# Altium integrated library esd_library.IntLib: 989 symbols (part 6 of 6)
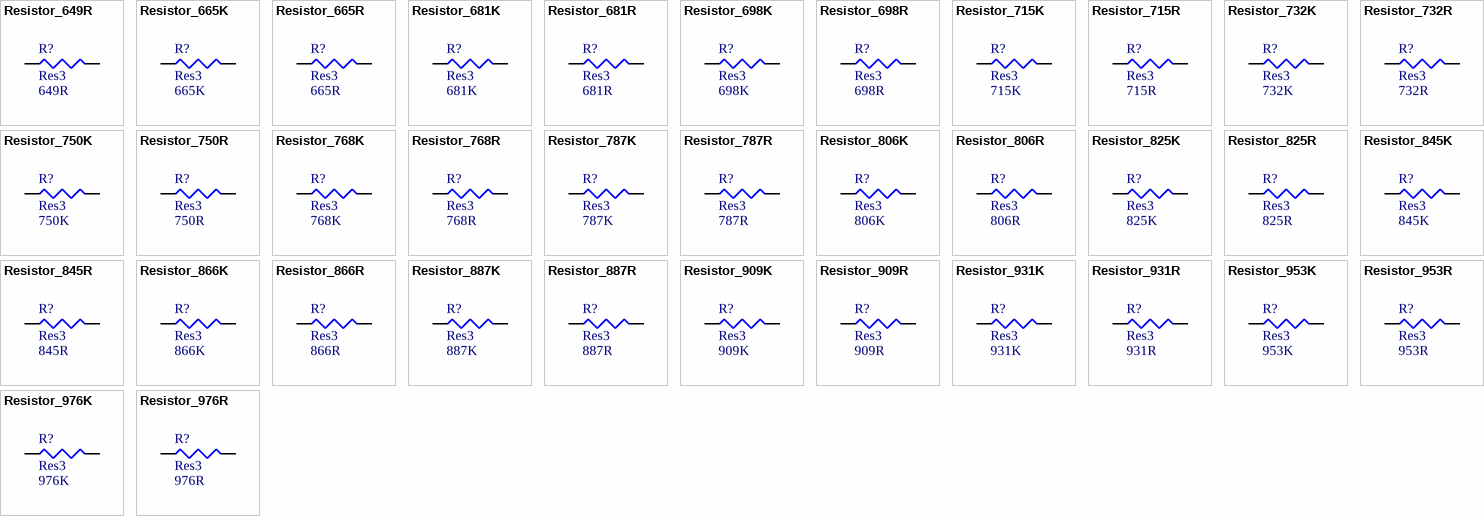
[diagram p31: symbols Resistor_649R to Resistor_976R]

## Resistor_665R
designator R?, comment Res3  value 665R
RES SMD 665R OHM 1% 1/8W 0805; MPN: CRCW0805665RFKEA; Name: Resistor_665R; PN: 541-665CCT-ND; URL: http://www.digikey.ca/product-detail/en/CRCW0805665RFKEA/541-665CCT-ND
footprint RESC2112X05M (Chip Resistor, 2-Leads, Body 2.05x1.25mm, IPC Low Density)
pins: 1, 2

## Resistor_681K
designator R?, comment Res3  value 681K
RES SMD 681K OHM 1% 1/8W 0805; MPN: CRCW0805681KFKEA; Name: Resistor_681K; PN: 541-681KCCT-ND; URL: http://www.digikey.ca/product-detail/en/CRCW0805681KFKEA/541-681KCCT-ND
footprint RESC2112X05M (Chip Resistor, 2-Leads, Body 2.05x1.25mm, IPC Low Density)
pins: 1, 2

## Resistor_681R
designator R?, comment Res3  value 681R
RES SMD 681R OHM 1% 1/8W 0805; MPN: CRCW0805681RFKEA; Name: Resistor_681R; PN: 541-681CCT-ND; URL: http://www.digikey.ca/product-detail/en/CRCW0805681RFKEA/541-681CCT-ND
footprint RESC2112X05M (Chip Resistor, 2-Leads, Body 2.05x1.25mm, IPC Low Density)
pins: 1, 2

## Resistor_698K
designator R?, comment Res3  value 698K
RES SMD 698K OHM 1% 1/8W 0805; MPN: CRCW0805698KFKEA; Name: Resistor_698K; PN: 541-698KCCT-ND; URL: http://www.digikey.ca/product-detail/en/CRCW0805698KFKEA/541-698KCCT-ND
footprint RESC2112X05M (Chip Resistor, 2-Leads, Body 2.05x1.25mm, IPC Low Density)
pins: 1, 2

## Resistor_698R
designator R?, comment Res3  value 698R
RES SMD 698R OHM 1% 1/8W 0805; MPN: CRCW0805698RFKEA; Name: Resistor_698R; PN: 541-698CCT-ND; URL: http://www.digikey.ca/product-detail/en/CRCW0805698RFKEA/541-698CCT-ND
footprint RESC2112X05M (Chip Resistor, 2-Leads, Body 2.05x1.25mm, IPC Low Density)
pins: 1, 2

## Resistor_715K
designator R?, comment Res3  value 715K
RES SMD 715K OHM 1% 1/8W 0805; MPN: CRCW0805715KFKEA; Name: Resistor_715K; PN: 541-715KCCT-ND; URL: http://www.digikey.ca/product-detail/en/CRCW0805715KFKEA/541-715KCCT-ND
footprint RESC2112X05M (Chip Resistor, 2-Leads, Body 2.05x1.25mm, IPC Low Density)
pins: 1, 2

## Resistor_715R
designator R?, comment Res3  value 715R
RES SMD 715R OHM 1% 1/8W 0805; MPN: CRCW0805715RFKEA; Name: Resistor_715R; PN: 541-715CCT-ND; URL: http://www.digikey.ca/product-detail/en/CRCW0805715RFKEA/541-715CCT-ND
footprint RESC2112X05M (Chip Resistor, 2-Leads, Body 2.05x1.25mm, IPC Low Density)
pins: 1, 2

## Resistor_732K
designator R?, comment Res3  value 732K
RES SMD 732K OHM 1% 1/8W 0805; MPN: CRCW0805732KFKEA; Name: Resistor_732K; PN: 541-732KCCT-ND; URL: http://www.digikey.ca/product-detail/en/CRCW0805732KFKEA/541-732KCCT-ND
footprint RESC2112X05M (Chip Resistor, 2-Leads, Body 2.05x1.25mm, IPC Low Density)
pins: 1, 2

## Resistor_732R
designator R?, comment Res3  value 732R
RES SMD 732R OHM 1% 1/8W 0805; MPN: CRCW0805732RFKEA; Name: Resistor_732R; PN: 541-732CCT-ND; URL: http://www.digikey.ca/product-detail/en/CRCW0805732RFKEA/541-732CCT-ND
footprint RESC2112X05M (Chip Resistor, 2-Leads, Body 2.05x1.25mm, IPC Low Density)
pins: 1, 2

## Resistor_750K
designator R?, comment Res3  value 750K
RES SMD 750K OHM 1% 1/8W 0805; MPN: CRCW0805750KFKEA; Name: Resistor_750K; PN: 541-750KCCT-ND; URL: http://www.digikey.ca/product-detail/en/CRCW0805750KFKEA/541-750KCCT-ND
footprint RESC2112X05M (Chip Resistor, 2-Leads, Body 2.05x1.25mm, IPC Low Density)
pins: 1, 2

## Resistor_750R
designator R?, comment Res3  value 750R
RES SMD 750R OHM 1% 1/8W 0805; MPN: CRCW0805750RFKEA; Name: Resistor_750R; PN: 541-750CCT-ND; URL: http://www.digikey.ca/product-detail/en/CRCW0805750RFKEA/541-750CCT-ND
footprint RESC2112X05M (Chip Resistor, 2-Leads, Body 2.05x1.25mm, IPC Low Density)
pins: 1, 2

## Resistor_768K
designator R?, comment Res3  value 768K
RES SMD 768K OHM 1% 1/8W 0805; MPN: CRCW0805768KFKEA; Name: Resistor_768K; PN: 541-768KCCT-ND; URL: http://www.digikey.ca/product-detail/en/CRCW0805768KFKEA/541-768KCCT-ND
footprint RESC2112X05M (Chip Resistor, 2-Leads, Body 2.05x1.25mm, IPC Low Density)
pins: 1, 2

## Resistor_768R
designator R?, comment Res3  value 768R
RES SMD 768R OHM 1% 1/8W 0805; MPN: CRCW0805768RFKEA; Name: Resistor_768R; PN: 541-768CCT-ND; URL: http://www.digikey.ca/product-detail/en/CRCW0805768RFKEA/541-768CCT-ND
footprint RESC2112X05M (Chip Resistor, 2-Leads, Body 2.05x1.25mm, IPC Low Density)
pins: 1, 2

## Resistor_787K
designator R?, comment Res3  value 787K
RES SMD 787K OHM 1% 1/8W 0805; MPN: CRCW0805787KFKEA; Name: Resistor_787K; PN: 541-787KCCT-ND; URL: http://www.digikey.ca/product-detail/en/CRCW0805787KFKEA/541-787KCCT-ND
footprint RESC2112X05M (Chip Resistor, 2-Leads, Body 2.05x1.25mm, IPC Low Density)
pins: 1, 2

## Resistor_787R
designator R?, comment Res3  value 787R
RES SMD 787R OHM 1% 1/8W 0805; MPN: CRCW0805787RFKEA; Name: Resistor_787R; PN: 541-787CCT-ND; URL: http://www.digikey.ca/product-detail/en/CRCW0805787RFKEA/541-787CCT-ND
footprint RESC2112X05M (Chip Resistor, 2-Leads, Body 2.05x1.25mm, IPC Low Density)
pins: 1, 2

## Resistor_806K
designator R?, comment Res3  value 806K
RES SMD 806K OHM 1% 1/8W 0805; MPN: CRCW0805806KFKEA; Name: Resistor_806K; PN: 541-806KCCT-ND; URL: http://www.digikey.ca/product-detail/en/CRCW0805806KFKEA/541-806KCCT-ND
footprint RESC2112X05M (Chip Resistor, 2-Leads, Body 2.05x1.25mm, IPC Low Density)
pins: 1, 2

## Resistor_806R
designator R?, comment Res3  value 806R
RES SMD 806R OHM 1% 1/8W 0805; MPN: CRCW0805806RFKEA; Name: Resistor_806R; PN: 541-806CCT-ND; URL: http://www.digikey.ca/product-detail/en/CRCW0805806RFKEA/541-806CCT-ND
footprint RESC2112X05M (Chip Resistor, 2-Leads, Body 2.05x1.25mm, IPC Low Density)
pins: 1, 2

## Resistor_825K
designator R?, comment Res3  value 825K
RES SMD 825K OHM 1% 1/8W 0805; MPN: CRCW0805825KFKEA; Name: Resistor_825K; PN: 541-825KCCT-ND; URL: http://www.digikey.ca/product-detail/en/CRCW0805825KFKEA/541-825KCCT-ND
footprint RESC2112X05M (Chip Resistor, 2-Leads, Body 2.05x1.25mm, IPC Low Density)
pins: 1, 2

## Resistor_825R
designator R?, comment Res3  value 825R
RES SMD 825R OHM 1% 1/8W 0805; MPN: CRCW0805825RFKEA; Name: Resistor_825R; PN: 541-825CCT-ND; URL: http://www.digikey.ca/product-detail/en/CRCW0805825RFKEA/541-825CCT-ND
footprint RESC2112X05M (Chip Resistor, 2-Leads, Body 2.05x1.25mm, IPC Low Density)
pins: 1, 2

## Resistor_845K
designator R?, comment Res3  value 845K
RES SMD 845K OHM 1% 1/8W 0805; MPN: CRCW0805845KFKEA; Name: Resistor_845K; PN: 541-845KCCT-ND; URL: http://www.digikey.ca/product-detail/en/CRCW0805845KFKEA/541-845KCCT-ND
footprint RESC2112X05M (Chip Resistor, 2-Leads, Body 2.05x1.25mm, IPC Low Density)
pins: 1, 2

## Resistor_845R
designator R?, comment Res3  value 845R
RES SMD 845R OHM 1% 1/8W 0805; MPN: CRCW0805845RFKEA; Name: Resistor_845R; PN: 541-845CCT-ND; URL: http://www.digikey.ca/product-detail/en/CRCW0805845RFKEA/541-845CCT-ND
footprint RESC2112X05M (Chip Resistor, 2-Leads, Body 2.05x1.25mm, IPC Low Density)
pins: 1, 2

## Resistor_866K
designator R?, comment Res3  value 866K
RES SMD 866K OHM 1% 1/8W 0805; MPN: CRCW0805866KFKEA; Name: Resistor_866K; PN: 541-866KCCT-ND; URL: http://www.digikey.ca/product-detail/en/CRCW0805866KFKEA/541-866KCCT-ND
footprint RESC2112X05M (Chip Resistor, 2-Leads, Body 2.05x1.25mm, IPC Low Density)
pins: 1, 2

## Resistor_866R
designator R?, comment Res3  value 866R
RES SMD 866R OHM 1% 1/8W 0805; MPN: CRCW0805866RFKEA; Name: Resistor_866R; PN: 541-866CCT-ND; URL: http://www.digikey.ca/product-detail/en/CRCW0805866RFKEA/541-866CCT-ND
footprint RESC2112X05M (Chip Resistor, 2-Leads, Body 2.05x1.25mm, IPC Low Density)
pins: 1, 2

## Resistor_887K
designator R?, comment Res3  value 887K
RES SMD 887K OHM 1% 1/8W 0805; MPN: CRCW0805887KFKEA; Name: Resistor_887K; PN: 541-887KCCT-ND; URL: http://www.digikey.ca/product-detail/en/CRCW0805887KFKEA/541-887KCCT-ND
footprint RESC2112X05M (Chip Resistor, 2-Leads, Body 2.05x1.25mm, IPC Low Density)
pins: 1, 2

## Resistor_887R
designator R?, comment Res3  value 887R
RES SMD 887R OHM 1% 1/8W 0805; MPN: CRCW0805887RFKEA; Name: Resistor_887R; PN: 541-887CCT-ND; URL: http://www.digikey.ca/product-detail/en/CRCW0805887RFKEA/541-887CCT-ND
footprint RESC2112X05M (Chip Resistor, 2-Leads, Body 2.05x1.25mm, IPC Low Density)
pins: 1, 2

## Resistor_909K
designator R?, comment Res3  value 909K
RES SMD 909K OHM 1% 1/8W 0805; MPN: CRCW0805909KFKEA; Name: Resistor_909K; PN: 541-909KCCT-ND; URL: http://www.digikey.ca/product-detail/en/CRCW0805909KFKEA/541-909KCCT-ND
footprint RESC2112X05M (Chip Resistor, 2-Leads, Body 2.05x1.25mm, IPC Low Density)
pins: 1, 2

## Resistor_909R
designator R?, comment Res3  value 909R
RES SMD 909R OHM 1% 1/8W 0805; MPN: CRCW0805909RFKEA; Name: Resistor_909R; PN: 541-909CCT-ND; URL: http://www.digikey.ca/product-detail/en/CRCW0805909RFKEA/541-909CCT-ND
footprint RESC2112X05M (Chip Resistor, 2-Leads, Body 2.05x1.25mm, IPC Low Density)
pins: 1, 2

## Resistor_931K
designator R?, comment Res3  value 931K
RES SMD 931K OHM 1% 1/8W 0805; MPN: CRCW0805931KFKEA; Name: Resistor_931K; PN: 541-931KCCT-ND; URL: http://www.digikey.ca/product-detail/en/CRCW0805931KFKEA/541-931KCCT-ND
footprint RESC2112X05M (Chip Resistor, 2-Leads, Body 2.05x1.25mm, IPC Low Density)
pins: 1, 2

## Resistor_931R
designator R?, comment Res3  value 931R
RES SMD 931R OHM 1% 1/8W 0805; MPN: CRCW0805931RFKEA; Name: Resistor_931R; PN: 541-931CCT-ND; URL: http://www.digikey.ca/product-detail/en/CRCW0805931RFKEA/541-931CCT-ND
footprint RESC2112X05M (Chip Resistor, 2-Leads, Body 2.05x1.25mm, IPC Low Density)
pins: 1, 2

## Resistor_953K
designator R?, comment Res3  value 953K
RES SMD 953K OHM 1% 1/8W 0805; MPN: CRCW0805953KFKEA; Name: Resistor_953K; PN: 541-953KCCT-ND; URL: http://www.digikey.ca/product-detail/en/CRCW0805953KFKEA/541-953KCCT-ND
footprint RESC2112X05M (Chip Resistor, 2-Leads, Body 2.05x1.25mm, IPC Low Density)
pins: 1, 2

## Resistor_953R
designator R?, comment Res3  value 953R
RES SMD 953R OHM 1% 1/8W 0805; MPN: CRCW0805953RFKEA; Name: Resistor_953R; PN: 541-953CCT-ND; URL: http://www.digikey.ca/product-detail/en/CRCW0805953RFKEA/541-953CCT-ND
footprint RESC2112X05M (Chip Resistor, 2-Leads, Body 2.05x1.25mm, IPC Low Density)
pins: 1, 2

## Resistor_976K
designator R?, comment Res3  value 976K
RES SMD 976K OHM 1% 1/8W 0805; MPN: CRCW0805976KFKEA; Name: Resistor_976K; PN: 541-976KCCT-ND; URL: http://www.digikey.ca/product-detail/en/CRCW0805976KFKEA/541-976KCCT-ND
footprint RESC2112X05M (Chip Resistor, 2-Leads, Body 2.05x1.25mm, IPC Low Density)
pins: 1, 2

## Resistor_976R
designator R?, comment Res3  value 976R
RES SMD 976R OHM 1% 1/8W 0805; MPN: CRCW0805976RFKEA; Name: Resistor_976R; PN: 541-976CCT-ND; URL: http://www.digikey.ca/product-detail/en/CRCW0805976RFKEA/541-976CCT-ND
footprint RESC2112X05M (Chip Resistor, 2-Leads, Body 2.05x1.25mm, IPC Low Density)
pins: 1, 2